# Altium footprint library GRIx4.PcbLib: 29 footprints (part 2 of 2)
Each footprint in its own frame and in the unit in brackets; x right, y up, seen from the top. Pads: shape width x height; smd on the part's side, far side on the other; paste and mask are expansions set on the pad; w line width, h text height; cw(c..) or ccw(c..) is an arc to the next point about the centre after c.
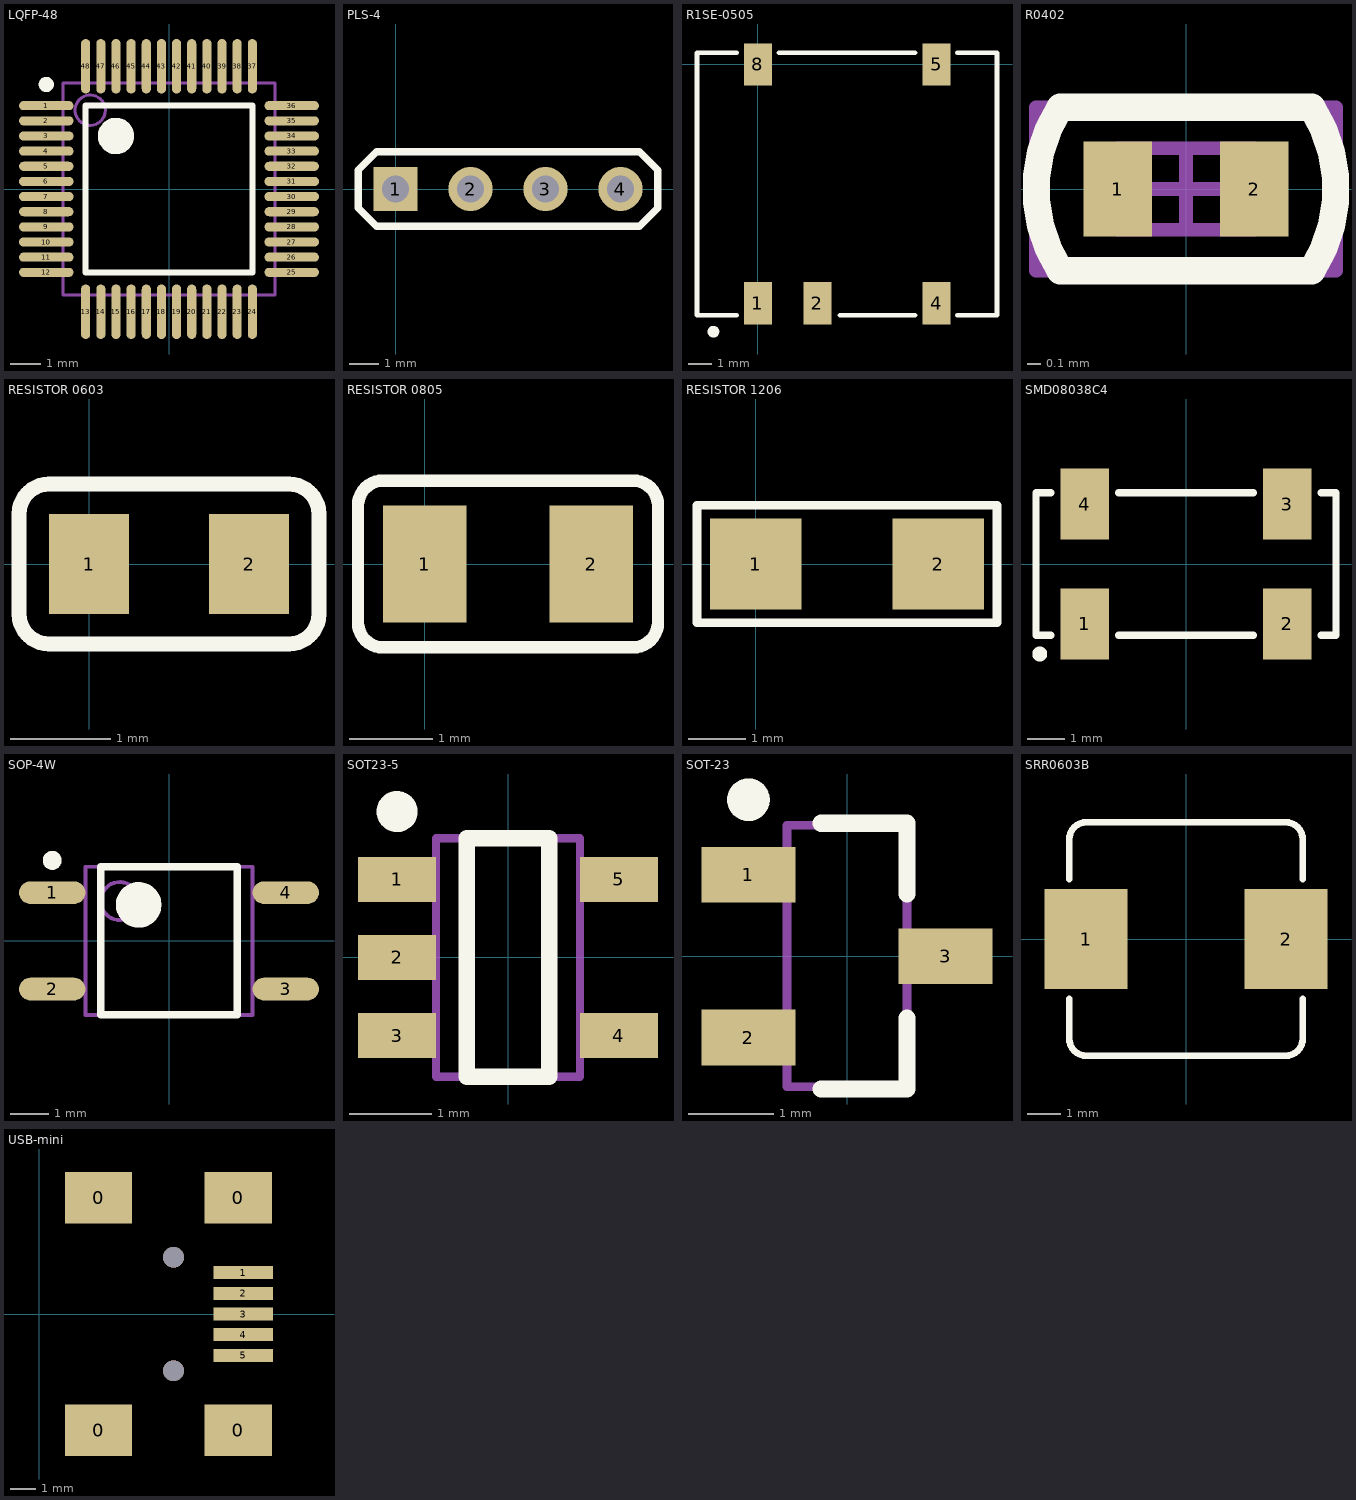
[diagram p1: the footprints below, top view; thin cyan lines are the x and y axes]

## LQFP-48 [mm]
pads (48):
  oval 1.8x0.3 smd: 1(-4.05,2.75) 2(-4.05,2.25) 3(-4.05,1.75) 4(-4.05,1.25) 5(-4.05,0.75) 6(-4.05,0.25) 7(-4.05,-0.25) 8(-4.05,-0.75) 9(-4.05,-1.25) 10(-4.05,-1.75) 11(-4.05,-2.25) 12(-4.05,-2.75) 25(4.05,-2.75) 26(4.05,-2.25) 27(4.05,-1.75) 28(4.05,-1.25) 29(4.05,-0.75) 30(4.05,-0.25) 31(4.05,0.25) 32(4.05,0.75) 33(4.05,1.25) 34(4.05,1.75) 35(4.05,2.25) 36(4.05,2.75)
  oval 0.3x1.8 smd: 13(-2.75,-4.05) 14(-2.25,-4.05) 15(-1.75,-4.05) 16(-1.25,-4.05) 17(-0.75,-4.05) 18(-0.25,-4.05) 19(0.25,-4.05) 20(0.75,-4.05) 21(1.25,-4.05) 22(1.75,-4.05) 23(2.25,-4.05) 24(2.75,-4.05) 37(2.75,4.05) 38(2.25,4.05) 39(1.75,4.05) 40(1.25,4.05) 41(0.75,4.05) 42(0.25,4.05) 43(-0.25,4.05) 44(-0.75,4.05) 45(-1.25,4.05) 46(-1.75,4.05) 47(-2.25,4.05) 48(-2.75,4.05)
Top Overlay:
  circle w0.25: c-4.05,3.45 r0.125
  circle w0.6: c-1.75,1.75 r0.3
  lines w0.2: -2.75,-2.75 -2.75,2.75 2.75,2.75 2.75,-2.75 -2.75,-2.75
Mechanical 13:
  circle w0.1: c-2.6,2.6 r0.5
  lines w0.1: -3.5,-3.5 -3.5,3.5 3.5,3.5 3.5,-3.5 -3.5,-3.5
3D body: height 1.6, standoff 0.05, extent -3.5,-3.5 3.5,3.5

## PLS-4 [mm]
pads (4):
  rect 1.5x1.5 hole 0.9: 1(0,0)
  round 1.5 hole 0.9: 2(2.54,0) 3(5.08,0) 4(7.62,0)
Top Overlay:
  lines w0.254: -1.27,-0.635 -0.635,-1.27 8.255,-1.27 8.89,-0.635 8.89,0.635 8.255,1.27 1.905,1.27 0.635,1.27 -0.635,1.27 -1.27,0.635 -1.27,-0.635
3D body: height 8.5, standoff -3, extent 2.24,-0.3 2.84,0.3
3D body: height 8.5, standoff -3, extent -0.3,-0.3 0.3,0.3
3D body: height 2, standoff 0, extent -1.118,-1.118 8.738,1.118
3D body: height 8.5, standoff -3, extent 4.78,-0.3 5.38,0.3
3D body: height 8.5, standoff -3, extent 7.32,-0.3 7.92,0.3

## R1SE-0505 [mm]
pads (5):
  rect 1.2x1.8 smd: 1(0,-10.19) 2(2.54,-10.19) 4(7.62,-10.19) 5(7.62,0) 8(0,0)
Top Overlay:
  circle w0.25: c-1.9,-11.4 r0.125
  lines w0.2: -0.9,-10.7 -2.6,-10.7 -2.6,0.5 -0.9,0.5 ; 0.9,0.5 6.7,0.5 ; 3.5,-10.7 6.7,-10.7 ; 8.5,-10.7 10.2,-10.7 10.2,0.5 8.5,0.5
3D body: height 7, standoff 0.01, extent -2.6,-10.65 10.2,0.45

## R0402 [mm] "1005M"
height 0.4
pads (2):
  rect 0.5x0.7 smd: 1(-0.5,0) 2(0.5,0)
Top Overlay:
  lines w0.2: -0.923,-0.599 cw(c0,0) -0.923,0.599 ; -0.9,-0.6 0.9,-0.6 ; -0.9,0.6 0.9,0.6 ; 0.923,-0.599 ccw(c0,0) 0.923,0.599
Mechanical 7:
  lines w0.05: -1.1,-0.6 -1.1,0.6 1.1,0.6 1.1,-0.6 -1.1,-0.6
  text ".Designator" at -0.7,-0.2 h0.7
Mechanical 13:
  lines w0.1: -0.5,-0.3 -0.5,0.3 0.5,0.3 0.5,-0.3 -0.5,-0.3
Mechanical 15:
  lines w0.1: -0.25,0 0.25,0 ; 0,-0.25 0,0.25 ; -1.1,-0.6 1.1,-0.6 1.1,0.6 -1.1,0.6 -1.1,-0.6
3D body: height 0.4, standoff 0, extent -0.5,-0.25 0.5,0.25

## RESISTOR 0603 [mm]
pads (2):
  rect 0.8x1 smd: 1(0,0) 2(1.6,0)
Top Overlay:
  lines w0.15: -0.7,-0.5 ccw(c-0.4,-0.5) -0.4,-0.8 2,-0.8 ccw(c2,-0.5) 2.3,-0.5 2.3,0.5 ccw(c2,0.5) 2,0.8 -0.4,0.8 ccw(c-0.4,0.5) -0.7,0.5 -0.7,-0.5
3D body: height 0.31, standoff 0, extent 1.32,-0.38 1.64,0.42
3D body: height 0.31, standoff 0, extent -0.01,-0.38 0.32,0.42
3D body: height 0.3, standoff 0, extent 0.02,-0.37 1.62,0.41

## RESISTOR 0805 [mm]
pads (2):
  rect 1x1.4 smd: 1(0,0) 2(2,0)
Top Overlay:
  lines w0.15: -0.8,-0.7 ccw(c-0.5,-0.7) -0.5,-1 2.5,-1 ccw(c2.5,-0.7) 2.8,-0.7 2.8,0.7 ccw(c2.5,0.7) 2.5,1 -0.5,1 ccw(c-0.5,0.7) -0.8,0.7 -0.8,-0.7
3D body: height 0.5, standoff 0, extent 0.33,-0.58 1.72,0.58
3D body: height 0.52, standoff 0, extent 1.7,-0.6 2.01,0.6
3D body: height 0.52, standoff 0, extent 0.01,-0.605 0.36,0.595

## RESISTOR 1206 [mm]
pads (2):
  rect 1.6x1.6 smd: 1(0,0) 2(3.2,0)
Top Overlay:
  lines w0.15: -1.025,-1.025 4.225,-1.025 4.225,1.025 -1.025,1.025 -1.025,-1.025
3D body: height 0.52, standoff 0, extent 2.88,-0.8 3.22,0.8
3D body: height 0.5, standoff 0, extent 0.31,-0.76 2.91,0.78
3D body: height 0.52, standoff 0, extent 0.01,-0.8 0.35,0.8

## SMD08038C4 [mm]
pads (4):
  rect 1.3x1.9 smd: 1(-2.7,-1.6) 2(2.7,-1.6) 3(2.7,1.6) 4(-2.7,1.6)
Top Overlay:
  circle w0.2: c-3.9,-2.4 r0.1
  lines w0.2: -3.6,-1.9 -4,-1.9 -4,1.9 -3.6,1.9 ; -1.8,-1.9 1.8,-1.9 ; -1.8,1.9 1.8,1.9 ; 3.6,-1.9 4,-1.9 4,1.9 3.6,1.9
3D body: height 1, standoff 0.01, extent -2.95,1.9 -2.45,2.1
3D body: height 2.5, standoff 0.01, extent -4,-1.9 4,1.9
3D body: height 1, standoff 0.01, extent -2.95,-2.1 -2.45,-1.9
3D body: height 1, standoff 0.01, extent 2.45,-2.1 2.95,-1.9
3D body: height 1, standoff 0.01, extent 2.45,1.9 2.95,2.1

## SOP-4W [mm]
pads (4):
  oval 1.75x0.6 smd: 1(-3.075,1.27) 2(-3.075,-1.27) 3(3.075,-1.27) 4(3.075,1.27)
Top Overlay:
  circle w0.6: c-0.8,0.95 r0.3
  circle w0.25: c-3.075,2.12 r0.125
  lines w0.2: -1.8,-1.95 1.8,-1.95 1.8,1.95 -1.8,1.95 -1.8,-1.95
Mechanical 13:
  circle w0.1: c-1.3,1.05 r0.5
  lines w0.1: -2.2,-1.95 2.2,-1.95 2.2,1.95 -2.2,1.95 -2.2,-1.95
3D body: height 2, standoff 0.01, extent -2.2,-1.95 2.2,1.95

## SOT23-5 [mm]
pads (5):
  rect 0.95x0.55 smd: 1(-1.35,0.95) 2(-1.35,0) 3(-1.35,-0.95) 4(1.35,-0.95) 5(1.35,0.95)
Top Overlay:
  circle w0.25: c-1.35,1.775 r0.125
  lines w0.2: -0.5,-1.45 -0.5,1.45 0.5,1.45 0.5,-1.45 -0.5,-1.45
Mechanical 13:
  lines w0.1: -0.875,-1.45 0.875,-1.45 0.875,1.45 -0.875,1.45 -0.875,-1.45
3D body: height 0.9, standoff 0.01, extent -0.875,-1.45 0.875,1.45

## SOT-23 [mm]
pads (3):
  rect 1.1x0.65 smd: 1(-1.15,0.95) 2(-1.15,-0.95) 3(1.15,0)
Top Overlay:
  circle w0.25: c-1.15,1.825 r0.125
  lines w0.2: -0.3,-1.55 0.7,-1.55 0.7,-0.725 ; -0.3,1.55 0.7,1.55 0.7,0.725
Mechanical 13:
  lines w0.1: -0.7,-1.525 -0.7,1.525 0.7,1.525 0.7,-1.525 -0.7,-1.525
3D body: height 1.1, standoff 0.1, extent -0.7,-1.525 0.7,1.525

## SRR0603B [mm]
pads (2):
  rect 2.5x3 smd: 1(-3,0) 2(3,0)
Top Overlay:
  lines w0.2: -3.5,-1.8 -3.5,-3 ccw(c-3,-3) -3,-3.5 3,-3.5 ccw(c3,-3) 3.5,-3 3.5,-1.8 ; -3.5,1.8 -3.5,3 cw(c-3,3) -3,3.5 3,3.5 cw(c3,3) 3.5,3 3.5,1.8
3D body: height 3.3, standoff 0.01, extent -3.5,-3.5 3.5,3.5
3D body: height 1, standoff 0.01, extent -3.4,-1 -3.2,1
3D body: height 1, standoff 0.01, extent 3.2,-1 3.4,1

## USB-mini [mm]
pads (9):
  rect 2.6x2 smd: 0(2.3,-4.5) 0(2.3,4.5) 0(7.7,-4.5) 0(7.7,4.5)
  rect 2.3x0.5 smd: 1(7.9,1.6) 2(7.9,0.8) 3(7.9,0) 4(7.9,-0.8) 5(7.9,-1.6)
via 5.2,-2.2 diameter 0.8 hole 0.8
via 5.2,2.2 diameter 0.8 hole 0.8
3D body: height 4.14, standoff -0.95, extent -0.7,-4.95 8.5,4.95